# Altium footprint library Reflow3D1411sep.PcbLib: 657 footprints (part 7 of 42)
Each footprint in its own frame and in the unit in brackets; x right, y up, seen from the top. Pads: shape width x height; smd on the part's side, far side on the other; paste and mask are expansions set on the pad; w line width, h text height; cw(c..) or ccw(c..) is an arc to the next point about the centre after c.
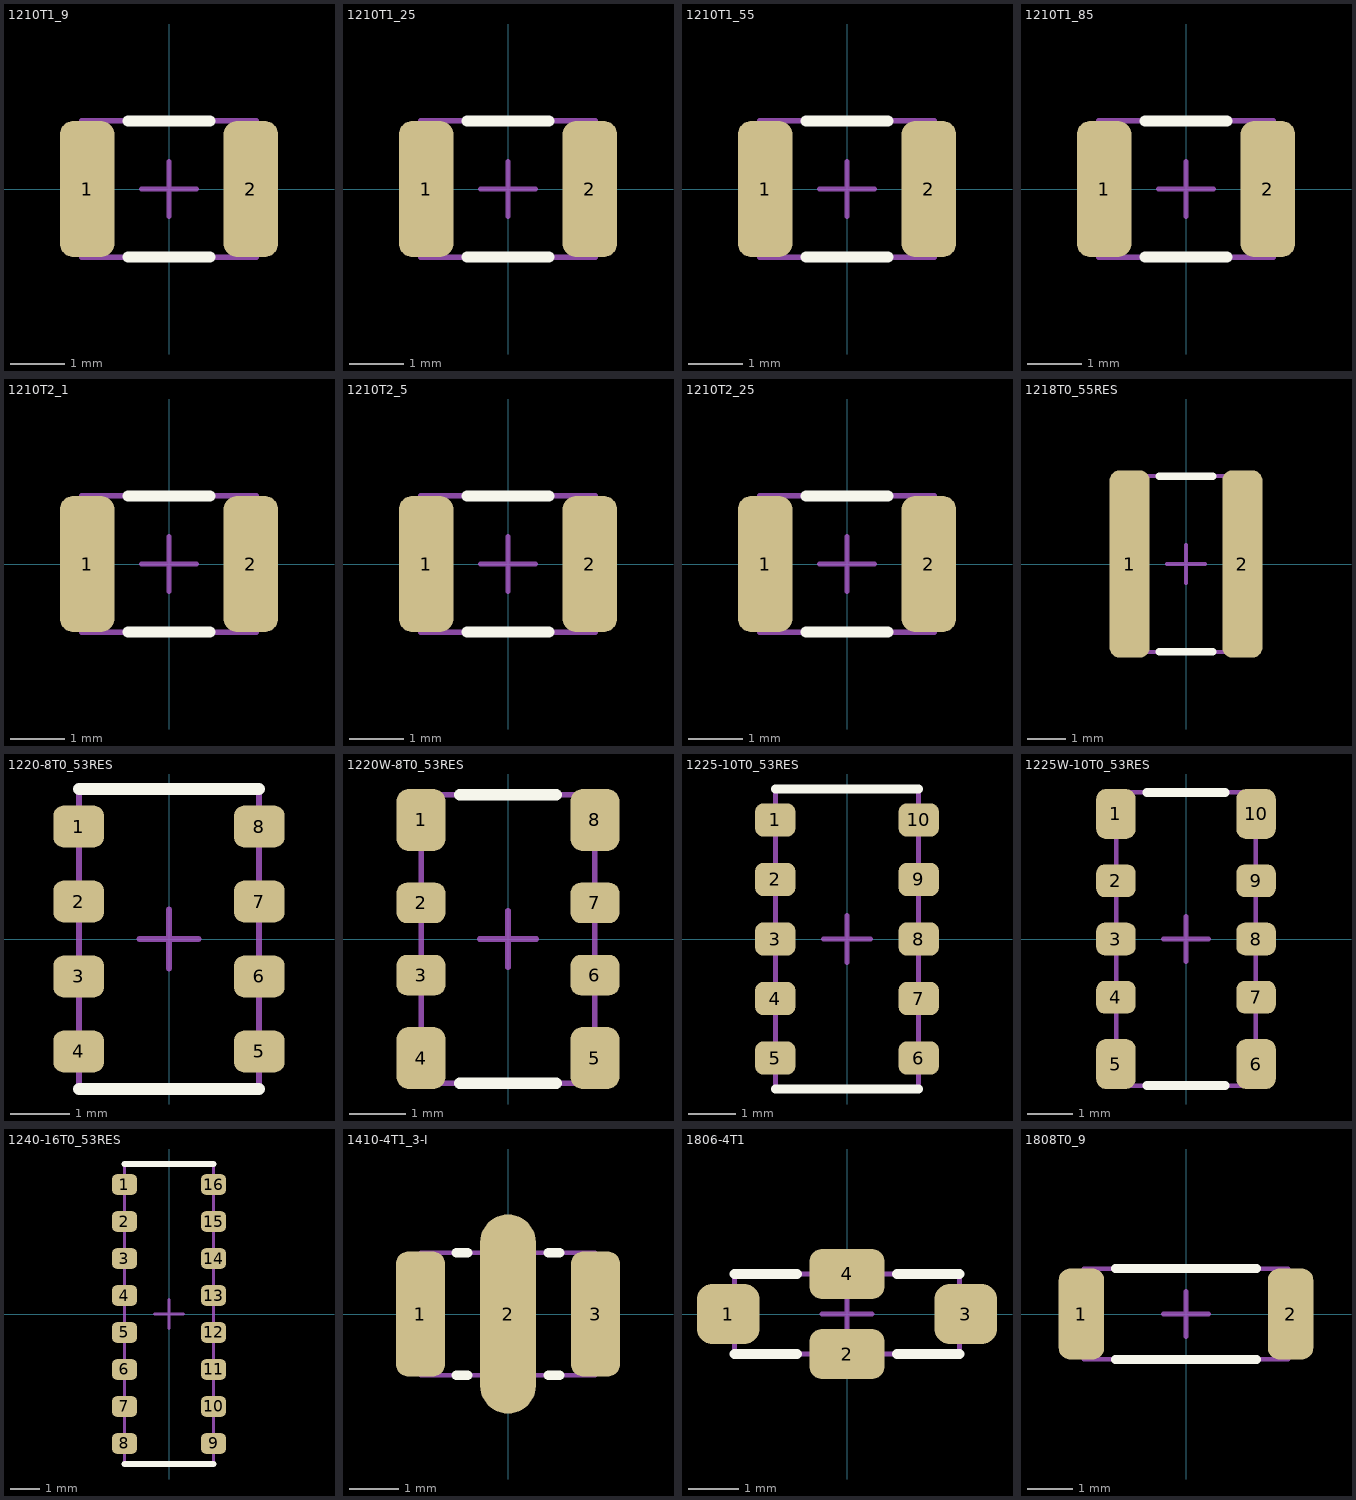
[diagram p6: the footprints below, top view; thin cyan lines are the x and y axes]

## 1210T1_9 [mm] "www.avx.com, smccp.pdf; www.kemet.com, F3102_C0G.pdf"
height 1.9
pads (2):
  rrect50% 1x2.5 smd mask+0.075: 1(-1.5,0) 2(1.5,0)
Top Overlay:
  lines w0.2: -0.75,-1.25 0.75,-1.25 ; -0.75,1.25 0.75,1.25
Mechanical 13:
  lines w0.1: -1.6,-1.25 -1.6,1.25 1.6,1.25 1.6,-1.25 -1.6,-1.25
Mechanical 15:
  lines w0.1: -0.5,0 0.5,0 ; 0,-0.5 0,0.5
3D body: height 2.1, standoff 0, extent -1.7,-1.35 1.7,1.35

## 1210T1_25 [mm] "www.avx.com, smccp.pdf; www.kemet.com, F3102_C0G.pdf"
height 1.25
pads (2):
  rrect50% 1x2.5 smd mask+0.075: 1(-1.5,0) 2(1.5,0)
Top Overlay:
  lines w0.2: -0.75,-1.25 0.75,-1.25 ; -0.75,1.25 0.75,1.25
Mechanical 13:
  lines w0.1: -1.6,-1.25 1.6,-1.25 1.6,1.25 -1.6,1.25 -1.6,-1.25
Mechanical 15:
  lines w0.1: -0.5,0 0.5,0 ; 0,-0.5 0,0.5
3D body: height 1.4, standoff 0, extent -1.7,-1.35 1.7,1.35

## 1210T1_55 [mm] "www.avx.com, smccp.pdf; www.kemet.com, F3102_C0G.pdf"
height 1.55
pads (2):
  rrect50% 1x2.5 smd mask+0.075: 1(-1.5,0) 2(1.5,0)
Top Overlay:
  lines w0.2: -0.75,-1.25 0.75,-1.25 ; -0.75,1.25 0.75,1.25
Mechanical 13:
  lines w0.1: -1.6,-1.25 1.6,-1.25 1.6,1.25 -1.6,1.25 -1.6,-1.25
Mechanical 15:
  lines w0.1: -0.5,0 0.5,0 ; 0,-0.5 0,0.5
3D body: height 1.7, standoff 0, extent -1.7,-1.35 1.7,1.35

## 1210T1_85 [mm] "www.avx.com, smccp.pdf; www.kemet.com, F3102_C0G.pdf"
height 1.85
pads (2):
  rrect50% 1x2.5 smd mask+0.075: 1(-1.5,0) 2(1.5,0)
Top Overlay:
  lines w0.2: -0.75,-1.25 0.75,-1.25 ; -0.75,1.25 0.75,1.25
Mechanical 13:
  lines w0.1: -1.6,-1.25 -1.6,1.25 1.6,1.25 1.6,-1.25 -1.6,-1.25
Mechanical 15:
  lines w0.1: -0.5,0 0.5,0 ; 0,-0.5 0,0.5
3D body: height 2.05, standoff 0, extent -1.7,-1.35 1.7,1.35

## 1210T2_1 [mm] "www.avx.com, smccp.pdf; www.kemet.com, F3102_C0G.pdf"
height 2.1
pads (2):
  rrect50% 1x2.5 smd mask+0.075: 1(-1.5,0) 2(1.5,0)
Top Overlay:
  lines w0.2: -0.75,-1.25 0.75,-1.25 ; -0.75,1.25 0.75,1.25
Mechanical 13:
  lines w0.1: -1.6,-1.25 1.6,-1.25 1.6,1.25 -1.6,1.25 -1.6,-1.25
Mechanical 15:
  lines w0.1: -0.5,0 0.5,0 ; 0,-0.5 0,0.5
3D body: height 2.3, standoff 0, extent -1.7,-1.35 1.7,1.35

## 1210T2_5 [mm] "www.avx.com, smccp.pdf; www.kemet.com, F3102_C0G.pdf"
height 2.5
pads (2):
  rrect50% 1x2.5 smd mask+0.075: 1(-1.5,0) 2(1.5,0)
Top Overlay:
  lines w0.2: -0.75,-1.25 0.75,-1.25 ; -0.75,1.25 0.75,1.25
Mechanical 13:
  lines w0.1: -1.6,-1.25 1.6,-1.25 1.6,1.25 -1.6,1.25 -1.6,-1.25
Mechanical 15:
  lines w0.1: -0.5,0 0.5,0 ; 0,-0.5 0,0.5
3D body: height 2.7, standoff 0, extent -1.7,-1.35 1.7,1.35

## 1210T2_25 [mm] "www.avx.com, smccp.pdf; www.kemet.com, F3102_C0G.pdf"
height 2.25
pads (2):
  rrect50% 1x2.5 smd mask+0.075: 1(-1.5,0) 2(1.5,0)
Top Overlay:
  lines w0.2: -0.75,-1.25 0.75,-1.25 ; -0.75,1.25 0.75,1.25
Mechanical 13:
  lines w0.1: -1.6,-1.25 -1.6,1.25 1.6,1.25 1.6,-1.25 -1.6,-1.25
Mechanical 15:
  lines w0.1: -0.5,0 0.5,0 ; 0,-0.5 0,0.5
3D body: height 2.45, standoff 0, extent -1.7,-1.35 1.7,1.35

## 1218T0_55RES [mm] "www.vishay.com, dcrcwe3.pdf"
height 0.55
pads (2):
  rrect50% 1.05x4.9 smd mask+0.075: 1(-1.475,0) 2(1.475,0)
Top Overlay:
  lines w0.2: -0.7,-2.3 0.7,-2.3 ; -0.7,2.3 0.7,2.3
Mechanical 13:
  lines w0.1: -1.6,-2.3 -1.6,2.3 1.6,2.3 1.6,-2.3 -1.6,-2.3
Mechanical 15:
  lines w0.1: -0.5,0 0.5,0 ; 0,-0.5 0,0.5
3D body: height 0.6, standoff 0, extent -1.65,-2.375 1.65,2.375

## 1220-8T0_53RES [mm] "www.vishay.com, cra12es.pdf, E-Version"
height 0.53
pads (8):
  rrect50% 0.86x0.71 smd mask+0.075: 1(-1.53,1.905) 2(-1.53,0.635) 3(-1.53,-0.635) 4(-1.53,-1.905) 5(1.53,-1.905) 6(1.53,-0.635) 7(1.53,0.635) 8(1.53,1.905)
Top Overlay:
  lines w0.2: -1.525,-2.54 1.525,-2.54 ; -1.525,2.54 1.525,2.54
Mechanical 13:
  lines w0.1: -1.525,-2.54 -1.525,2.54 1.525,2.54 1.525,-2.54 -1.525,-2.54
Mechanical 15:
  lines w0.1: -0.5,0 0.5,0 ; 0,-0.5 0,0.5
3D body: height 0.63, standoff 0, extent -1.6,-2.615 1.6,2.615

## 1220W-8T0_53RES [mm] "www.vishay.com, cra12es.pdf, S-Version"
height 0.53
pads (8):
  rrect50% 0.86x1.09 smd mask+0.075: 1(-1.53,2.095) 4(-1.53,-2.095) 5(1.53,-2.095) 8(1.53,2.095)
  rrect50% 0.86x0.71 smd mask+0.075: 2(-1.53,0.635) 3(-1.53,-0.635) 6(1.53,-0.635) 7(1.53,0.635)
Top Overlay:
  lines w0.2: -0.85,-2.54 0.85,-2.54 ; -0.85,2.54 0.85,2.54
Mechanical 13:
  lines w0.1: -1.525,-2.54 1.525,-2.54 1.525,2.54 -1.525,2.54 -1.525,-2.54
Mechanical 15:
  lines w0.1: -0.5,0 0.5,0 ; 0,-0.5 0,0.5
3D body: height 0.63, standoff 0, extent -1.6,-2.615 1.6,2.615

## 1225-10T0_53RES [mm] "www.vishay.com, cra12es.pdf, E-Version"
height 0.53
pads (10):
  rrect50% 0.86x0.71 smd mask+0.075: 1(-1.53,2.54) 2(-1.53,1.27) 3(-1.53,0) 4(-1.53,-1.27) 5(-1.53,-2.54) 6(1.53,-2.54) 7(1.53,-1.27) 8(1.53,0) 9(1.53,1.27) 10(1.53,2.54)
Top Overlay:
  lines w0.2: -1.525,-3.2 1.525,-3.2 ; -1.525,3.2 1.525,3.2
Mechanical 13:
  lines w0.1: -1.525,-3.2 1.525,-3.2 1.525,3.2 -1.525,3.2 -1.525,-3.2
Mechanical 15:
  lines w0.1: -0.5,0 0.5,0 ; 0,-0.5 0,0.5
3D body: height 0.63, standoff 0, extent -1.6,-3.275 1.6,3.275

## 1225W-10T0_53RES [mm] "www.vishay.com, cra12es.pdf, S-Version"
height 0.53
pads (10):
  rrect50% 0.86x1.09 smd mask+0.075: 1(-1.53,2.73) 5(-1.53,-2.73) 6(1.53,-2.73) 10(1.53,2.73)
  rrect50% 0.86x0.71 smd mask+0.075: 2(-1.53,1.27) 3(-1.53,0) 4(-1.53,-1.27) 7(1.53,-1.27) 8(1.53,0) 9(1.53,1.27)
Top Overlay:
  lines w0.2: -0.85,-3.2 0.85,-3.2 ; -0.85,3.2 0.85,3.2
Mechanical 13:
  lines w0.1: -1.525,-3.2 1.525,-3.2 1.525,3.2 -1.525,3.2 -1.525,-3.2
Mechanical 15:
  lines w0.1: -0.5,0 0.5,0 ; 0,-0.5 0,0.5
3D body: height 0.63, standoff 0, extent -1.6,-3.275 1.6,3.275

## 1240-16T0_53RES [mm] "www.vishay.com, cra12es.pdf, E-Version"
height 0.53
pads (16):
  rrect50% 0.86x0.71 smd mask+0.075: 1(-1.53,4.445) 2(-1.53,3.175) 3(-1.53,1.905) 4(-1.53,0.635) 5(-1.53,-0.635) 6(-1.53,-1.905) 7(-1.53,-3.175) 8(-1.53,-4.445) 9(1.53,-4.445) 10(1.53,-3.175) 11(1.53,-1.905) 12(1.53,-0.635) 13(1.53,0.635) 14(1.53,1.905) 15(1.53,3.175) 16(1.53,4.445)
Top Overlay:
  lines w0.2: -1.525,-5.15 1.525,-5.15 ; -1.525,5.15 1.525,5.15
Mechanical 13:
  lines w0.1: -1.525,-5.15 -1.525,5.15 1.525,5.15 1.525,-5.15 -1.525,-5.15
Mechanical 15:
  lines w0.1: -0.5,0 0.5,0 ; 0,-0.5 0,0.5
3D body: height 0.63, standoff 0, extent -1.6,-5.225 1.6,5.225

## 1410-4T1_3-I [mm] "www.yageo.com, X2Y_series_13.pdf"
height 1.3
pads (3):
  rrect50% 1x2.55 smd mask+0.075: 1(-1.785,0) 3(1.785,0)
  oval 1.14x4.06 smd mask+0.075: 2(0,0)
Top Overlay:
  lines w0.2: -1.05,-1.25 -0.825,-1.25 ; -1.05,1.25 -0.825,1.25 ; 0.825,-1.25 1.05,-1.25 ; 0.825,1.25 1.05,1.25
Mechanical 13:
  lines w0.1: -1.78,-1.25 1.78,-1.25 1.78,1.25 -1.78,1.25 -1.78,-1.25
Mechanical 15:
  lines w0.1: -0.5,0 0.5,0 ; 0,-0.5 0,0.5
3D body: height 1.5, standoff 0, extent -1.88,-1.35 1.88,1.35

## 1806-4T1 [mm] "www.murata.com, c31e.pdf, NFM41P"
height 1
pads (4):
  rrect50% 1.25x1.2 smd paste-25.4 mask+0.075: 1(-2.375,0) 3(2.375,0)
  rrect50% 1.5x1 smd paste-25.4 mask+0.075: 2(0,-0.8) 4(0,0.8)
Top Overlay:
  lines w0.2: -2.25,-0.8 -1,-0.8 ; -2.25,0.8 -1,0.8 ; 1,-0.8 2.25,-0.8 ; 1,0.8 2.25,0.8
Top Paste:
  region: 0.75,0.3 0.75,1.3 -0.75,1.3 -0.75,0.3
  region: 0.75,-1.3 0.75,-0.3 -0.75,-0.3 -0.75,-1.3
  region: 2.75,-0.5 2.75,0.5 1.75,0.5 1.75,-0.5
  region: -1.75,-0.5 -1.75,0.5 -2.75,0.5 -2.75,-0.5
Mechanical 13:
  lines w0.1: -2.25,-0.8 2.25,-0.8 2.25,0.8 -2.25,0.8 -2.25,-0.8
Mechanical 15:
  lines w0.1: -0.5,0 0.5,0 ; 0,-0.5 0,0.5
3D body: height 1.2, standoff 0, extent -2.4,-0.95 2.4,0.95

## 1808T0_9 [mm] "www.avx.com, smccp.pdf; www.kemet.com, F3102_C0G.pdf"
height 0.9
pads (2):
  rrect50% 1x2 smd mask+0.075: 1(-2.3,0) 2(2.3,0)
Top Overlay:
  lines w0.2: -1.55,-1 1.55,-1 ; -1.55,1 1.55,1
Mechanical 13:
  lines w0.1: -2.25,-1 -2.25,1 2.25,1 2.25,-1 -2.25,-1
Mechanical 15:
  lines w0.1: -0.5,0 0.5,0 ; 0,-0.5 0,0.5
3D body: height 1, standoff 0, extent -2.4,-1.1 2.4,1.1